# Altium footprint library 布洛电子PCB封装库-通用接插件.PcbLib: 103 footprints (part 6 of 7)
Each footprint in its own frame and in the unit in brackets; x right, y up, seen from the top. Pads: shape width x height; smd on the part's side, far side on the other; paste and mask are expansions set on the pad; w line width, h text height; cw(c..) or ccw(c..) is an arc to the next point about the centre after c.
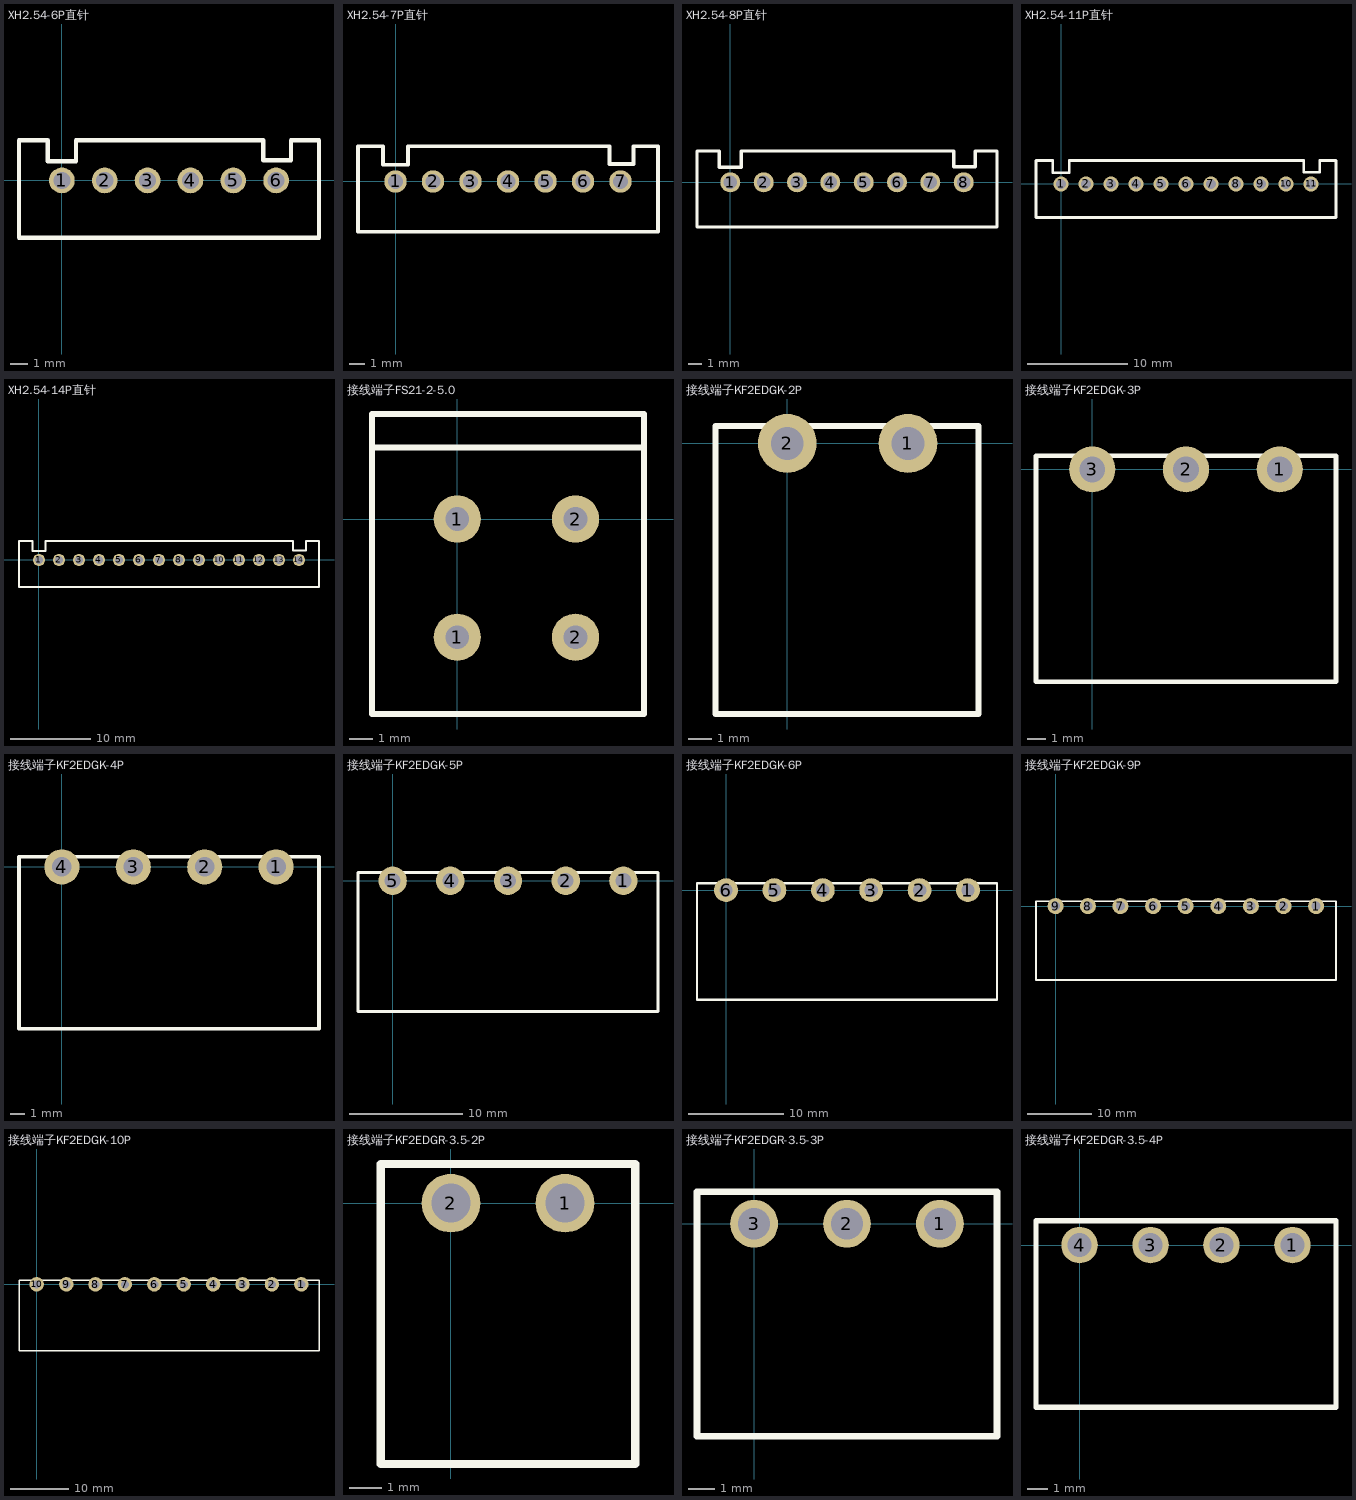
[diagram p5: the footprints below, top view; thin cyan lines are the x and y axes]

## XH2.54-6P直针 [mm]
pads (6):
  round 1.5 hole 1: 1(0,0) 2(2.5,0) 3(5,0) 4(7.5,0) 5(10,0) 6(12.5,0)
Top Overlay:
  lines w0.254: -2.5,-3.35 -2.5,0 -2.5,2.35 -0.826,2.35 -0.826,1.118 0.826,1.118 0.826,2.35 11.756,2.35 11.756,1.168 13.37,1.168 13.37,2.35 15,2.35 15,-3.35 10,-3.35 -2.5,-3.35
3D body: height 7, standoff -3.4, extent -2.477,-3.378 14.923,2.372

## XH2.54-7P直针 [mm]
pads (7):
  round 1.5 hole 1: 1(0,0) 2(2.5,0) 3(5,0) 4(7.5,0) 5(10,0) 6(12.5,0) 7(15,0)
Top Overlay:
  lines w0.254: -2.5,-3.35 -2.5,0 -2.5,2.35 -0.826,2.35 -0.826,1.118 0.826,1.118 0.826,2.35 14.256,2.35 14.256,1.168 15.87,1.168 15.87,2.35 17.5,2.35 17.5,-3.35 10,-3.35 -2.5,-3.35
3D body: height 7, standoff -3.4, extent -2.457,-3.378 17.443,2.372

## XH2.54-8P直针 [mm]
pads (8):
  round 1.5 hole 1: 1(0,0) 2(2.5,0) 3(5,0) 4(7.5,0) 5(10,0) 6(12.5,0) 7(15,0) 8(17.5,0)
Top Overlay:
  lines w0.254: -2.5,-3.35 -2.5,0 -2.5,2.35 -0.826,2.35 -0.826,1.118 0.826,1.118 0.826,2.35 16.756,2.35 16.756,1.168 18.37,1.168 18.37,2.35 20,2.35 20,-3.35 10,-3.35 -2.5,-3.35
3D body: height 7, standoff -3.4, extent -2.385,-3.439 20.015,2.311

## XH2.54-11P直针 [mm]
pads (11):
  round 1.5 hole 1: 1(0,0) 2(2.5,0) 3(5,0) 4(7.5,0) 5(10,0) 6(12.5,0) 7(15,0) 8(17.5,0) 9(20,0) 10(22.5,0) 11(25,0)
Top Overlay:
  lines w0.254: -2.5,-3.35 10,-3.35 20,-3.35 27.5,-3.35 27.5,2.35 25.87,2.35 25.87,1.168 24.256,1.168 24.256,2.35 16.756,2.35 0.826,2.35 0.826,1.118 -0.826,1.118 -0.826,2.35 -2.5,2.35 -2.5,0 -2.5,-3.35

## XH2.54-14P直针 [mm]
pads (14):
  round 1.5 hole 1: 1(0,0) 2(2.5,0) 3(5,0) 4(7.5,0) 5(10,0) 6(12.5,0) 7(15,0) 8(17.5,0) 9(20,0) 10(22.5,0) 11(25,0) 12(27.5,0) 13(30,0) 14(32.5,0)
Top Overlay:
  lines w0.254: -2.5,-3.35 -2.5,0 -2.5,2.35 -0.826,2.35 -0.826,1.118 0.826,1.118 0.826,2.35 16.756,2.35 24.256,2.35 31.756,2.35 31.756,1.168 33.37,1.168 33.37,2.35 35,2.35 35,-3.35 27.5,-3.35 20,-3.35 10,-3.35 -2.5,-3.35

## 接线端子FS21-2-5.0 [mm]
pads (4):
  round 2 hole 1: 1(0,-5.004) 1(0,0) 2(5.004,-5.004) 2(5.004,0)
Top Overlay:
  lines w0.254: -3.607,-1.067 -3.607,4.445 0.33,4.445 ; -3.607,-0.178 -3.607,-8.255 0,-8.255 7.899,-8.255 7.899,-4.699 7.899,-1.27 7.899,4.445 0,4.445 ; -3.607,3.023 7.899,3.023

## 接线端子KF2EDGK-2P [mm]
pads (2):
  round 2.5 hole 1.4: 1(5.131,0) 2(0,0)
Top Overlay:
  lines w0.254: -3.048,-11.506 8.128,-11.506 8.128,0.737 0.737,0.737 -3.048,0.737 -3.048,-11.506

## 接线端子KF2EDGK-3P [mm]
pads (3):
  round 2.5 hole 1.4: 1(10.16,0) 2(5.08,0) 3(0,0)
Top Overlay:
  lines w0.254: -3.048,-11.506 3.048,-11.506 13.208,-11.506 13.208,0.737 3.048,0.737 -3.048,0.737 -3.048,-11.506

## 接线端子KF2EDGK-4P [mm]
pads (4):
  round 2.5 hole 1.4: 1(15.24,0) 2(10.16,0) 3(5.08,0) 4(0,0)
Top Overlay:
  lines w0.254: -3.048,-11.506 -3.048,0.737 0.737,0.737 8.128,0.737 18.288,0.737 18.288,-11.506 8.128,-11.506 -3.048,-11.506

## 接线端子KF2EDGK-5P [mm]
pads (5):
  round 2.5 hole 1.4: 1(20.32,0) 2(15.24,0) 3(10.16,0) 4(5.08,0) 5(0,0)
Top Overlay:
  lines w0.254: -3.048,-11.506 -3.048,0.737 0.737,0.737 8.128,0.737 18.288,0.737 23.368,0.737 23.368,-11.506 18.288,-11.506 8.128,-11.506 -3.048,-11.506

## 接线端子KF2EDGK-6P [mm]
pads (6):
  round 2.5 hole 1.4: 1(25.4,0) 2(20.32,0) 3(15.24,0) 4(10.16,0) 5(5.08,0) 6(0,0)
Top Overlay:
  lines w0.254: -3.048,-11.506 8.128,-11.506 18.288,-11.506 28.448,-11.506 28.448,0.737 18.288,0.737 8.128,0.737 0.737,0.737 -3.048,0.737 -3.048,-11.506

## 接线端子KF2EDGK-9P [mm]
pads (9):
  round 2.5 hole 1.4: 1(40.589,0) 2(35.509,0) 3(30.429,0) 4(25.349,0) 5(20.269,0) 6(15.189,0) 7(10.109,0) 8(5.029,0) 9(0,0)
Top Overlay:
  lines w0.254: -3.048,-11.506 -3.048,0.737 0.737,0.737 8.128,0.737 18.288,0.737 23.368,0.737 43.688,0.737 43.688,-11.506 23.368,-11.506 18.288,-11.506 8.128,-11.506 -3.048,-11.506

## 接线端子KF2EDGK-10P [mm]
pads (10):
  round 2.5 hole 1.4: 1(45.72,0) 2(40.64,0) 3(35.56,0) 4(30.48,0) 5(25.4,0) 6(20.32,0) 7(15.24,0) 8(10.16,0) 9(5.131,0) 10(0,0)
Top Overlay:
  lines w0.254: -3.048,-11.506 8.128,-11.506 18.288,-11.506 23.368,-11.506 48.768,-11.506 48.768,0.737 23.368,0.737 18.288,0.737 8.128,0.737 0.737,0.737 -3.048,0.737 -3.048,-11.506

## 接线端子KF2EDGR-3.5-2P [mm]
pads (2):
  round 1.8 hole 1.2: 1(3.5,0) 2(0,0)
Top Overlay:
  lines w0.254: -2.15,-8 -2.15,1.2 5.65,1.2 5.65,-8 -2.15,-8
3D body: height 7, standoff -3.5, extent -2.438,-8.004 5.962,1.196

## 接线端子KF2EDGR-3.5-3P [mm]
pads (3):
  round 1.8 hole 1.2: 1(7,0) 2(3.5,0) 3(0,0)
Top Overlay:
  lines w0.254: -2.15,-8 9.15,-8 9.15,1.2 -2.15,1.2 -2.15,-8
3D body: height 7, standoff -3.5, extent 0.914,-7.953 9.314,1.247
3D body: height 7, standoff -3.5, extent -2.337,-7.927 6.063,1.273

## 接线端子KF2EDGR-3.5-4P [mm]
pads (4):
  round 1.8 hole 1.2: 1(10.5,0) 2(7,0) 3(3.5,0) 4(0,0)
Top Overlay:
  lines w0.254: -2.15,-8 -2.15,1.2 12.65,1.2 12.65,-8 -2.15,-8
3D body: height 7, standoff -3.5, extent -2.4,-7.978 6,1.222
3D body: height 7, standoff -3.5, extent 4.534,-7.953 12.934,1.247